# Altium footprint library PowerSupply.PcbLib: 67 footprints (part 5 of 5)
Each footprint in its own frame and in the unit in brackets; x right, y up, seen from the top. Pads: shape width x height; smd on the part's side, far side on the other; paste and mask are expansions set on the pad; w line width, h text height; cw(c..) or ccw(c..) is an arc to the next point about the centre after c.
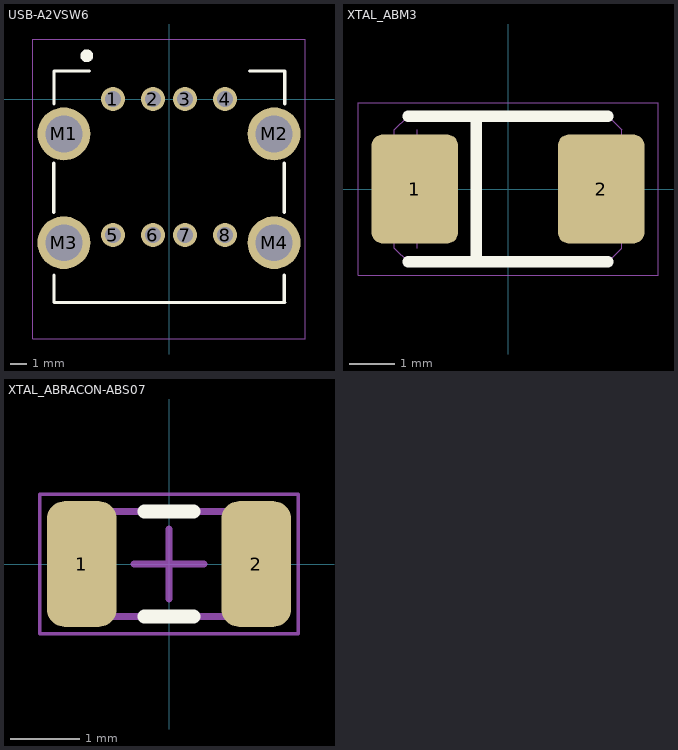
[diagram p4: the footprints below, top view; thin cyan lines are the x and y axes]

## USB-A2VSW6 [mm] "USB - A, Stacked Receptacle Connector 8 Position Through Hole"
height 15
pads (12):
  round 1.5 hole 1: 1(-3.5,0) 2(-1,0) 3(1,0) 4(3.5,0) 5(-3.5,-8.5) 6(-1,-8.5) 7(1,-8.5) 8(3.5,-8.5)
  round 3.3 hole 2.3: M1(-6.57,-2.18) M2(6.57,-2.18) M3(-6.57,-8.98) M4(6.57,-8.98)
Top Overlay:
  circle w0.4: c-5.135,2.7 r0.2
  lines w0.2: -7.2,-7.075 -7.2,-4 ; -7.195,-11 -7.195,-12.725 7.23,-12.725 ; -7.185,-0.3 -7.185,1.75 -4.96,1.75 ; 5.04,1.75 7.24,1.75 7.24,-0.3 ; 7.2,-7.075 7.2,-4 ; 7.205,-12.725 7.205,-11
Top Courtyard:
  lines w0: -8.5,-15 8.5,-15 8.5,3.75 -8.5,3.75 -8.5,-15
3D body "USB-A2VSXX.STP": height 17.4, standoff -3.6, extent -7.79,-13.41 7.81,2.21

## XTAL_ABM3 [mm] "CRYSTAL 25.0000MHZ 18PF SMD 5x3.2mm"
height 1.3
pads (2):
  rrect25% 1.9x2.4 smd mask+0.1: 1(-2.05,0) 2(2.05,0)
Top Overlay:
  lines w0.25: -2.2,-1.6 2.2,-1.6 ; -2.2,1.6 2.2,1.6 ; -0.7,-1.6 -0.7,1.6
Top Assembly Drawing:
  lines w0.01: -2,-1.3 -2,1.3 ; -2.5,-1.3 -2.5,1.3 -2.2,1.6 2.2,1.6 2.5,1.3 2.5,-1.3 2.2,-1.6 -2.2,-1.6 -2.5,-1.3
Top Courtyard:
  lines w0.01: -3.3,-1.9 3.3,-1.9 3.3,-1.8 3.3,1.9 -3.3,1.9 -3.3,1.8 -3.3,-1.9
3D body: height 1.3, standoff 0, extent -2.196,0.301 -1.2,1.299
3D body: height 1.3, standoff 0, extent -2.196,-1.299 -1.2,-0.301
3D body: height 1.3, standoff 0, extent 1.204,0.301 2.2,1.299
3D body: height 1.3, standoff 0, extent 1.204,-1.299 2.2,-0.301
3D body: height 1.3, standoff 0, extent -2.203,-1.299 2.2,1.3
3D body: height 0.4, standoff 0, extent -2.5,-1.6 2.5,1.6

## XTAL_ABRACON-ABS07 [mm] "Abracon ABS07 Series 3.2x1.5x0.9mm"
height 0.9
pads (2):
  rrect50% 1x1.8 smd: 1(-1.25,0) 2(1.25,0)
Top Overlay:
  lines w0.2: -0.35,-0.75 0.35,-0.75 ; -0.35,0.75 0.35,0.75
Top Assembly RefDes:
  text "'.Designator'" at -0.6,-0.3 h0.5
3D Models:
  lines w0.1: -1.6,-0.75 1.6,-0.75 1.6,0.75 -1.6,0.75 -1.6,-0.75
Top Courtyard:
  lines w0.05: -1.85,-1 1.85,-1 1.85,1 -1.85,1 -1.85,-1
  lines w0.1: -0.5,0 0.5,0 ; 0,-0.5 0,0.5
3D body "ABS07.STEP": height 0.9, standoff 0.01, extent -1.6,-0.749 1.6,0.749